# Altium schematic symbol library Electronic Devices_LIB.SchLib: 703 symbols (part 2 of 8)
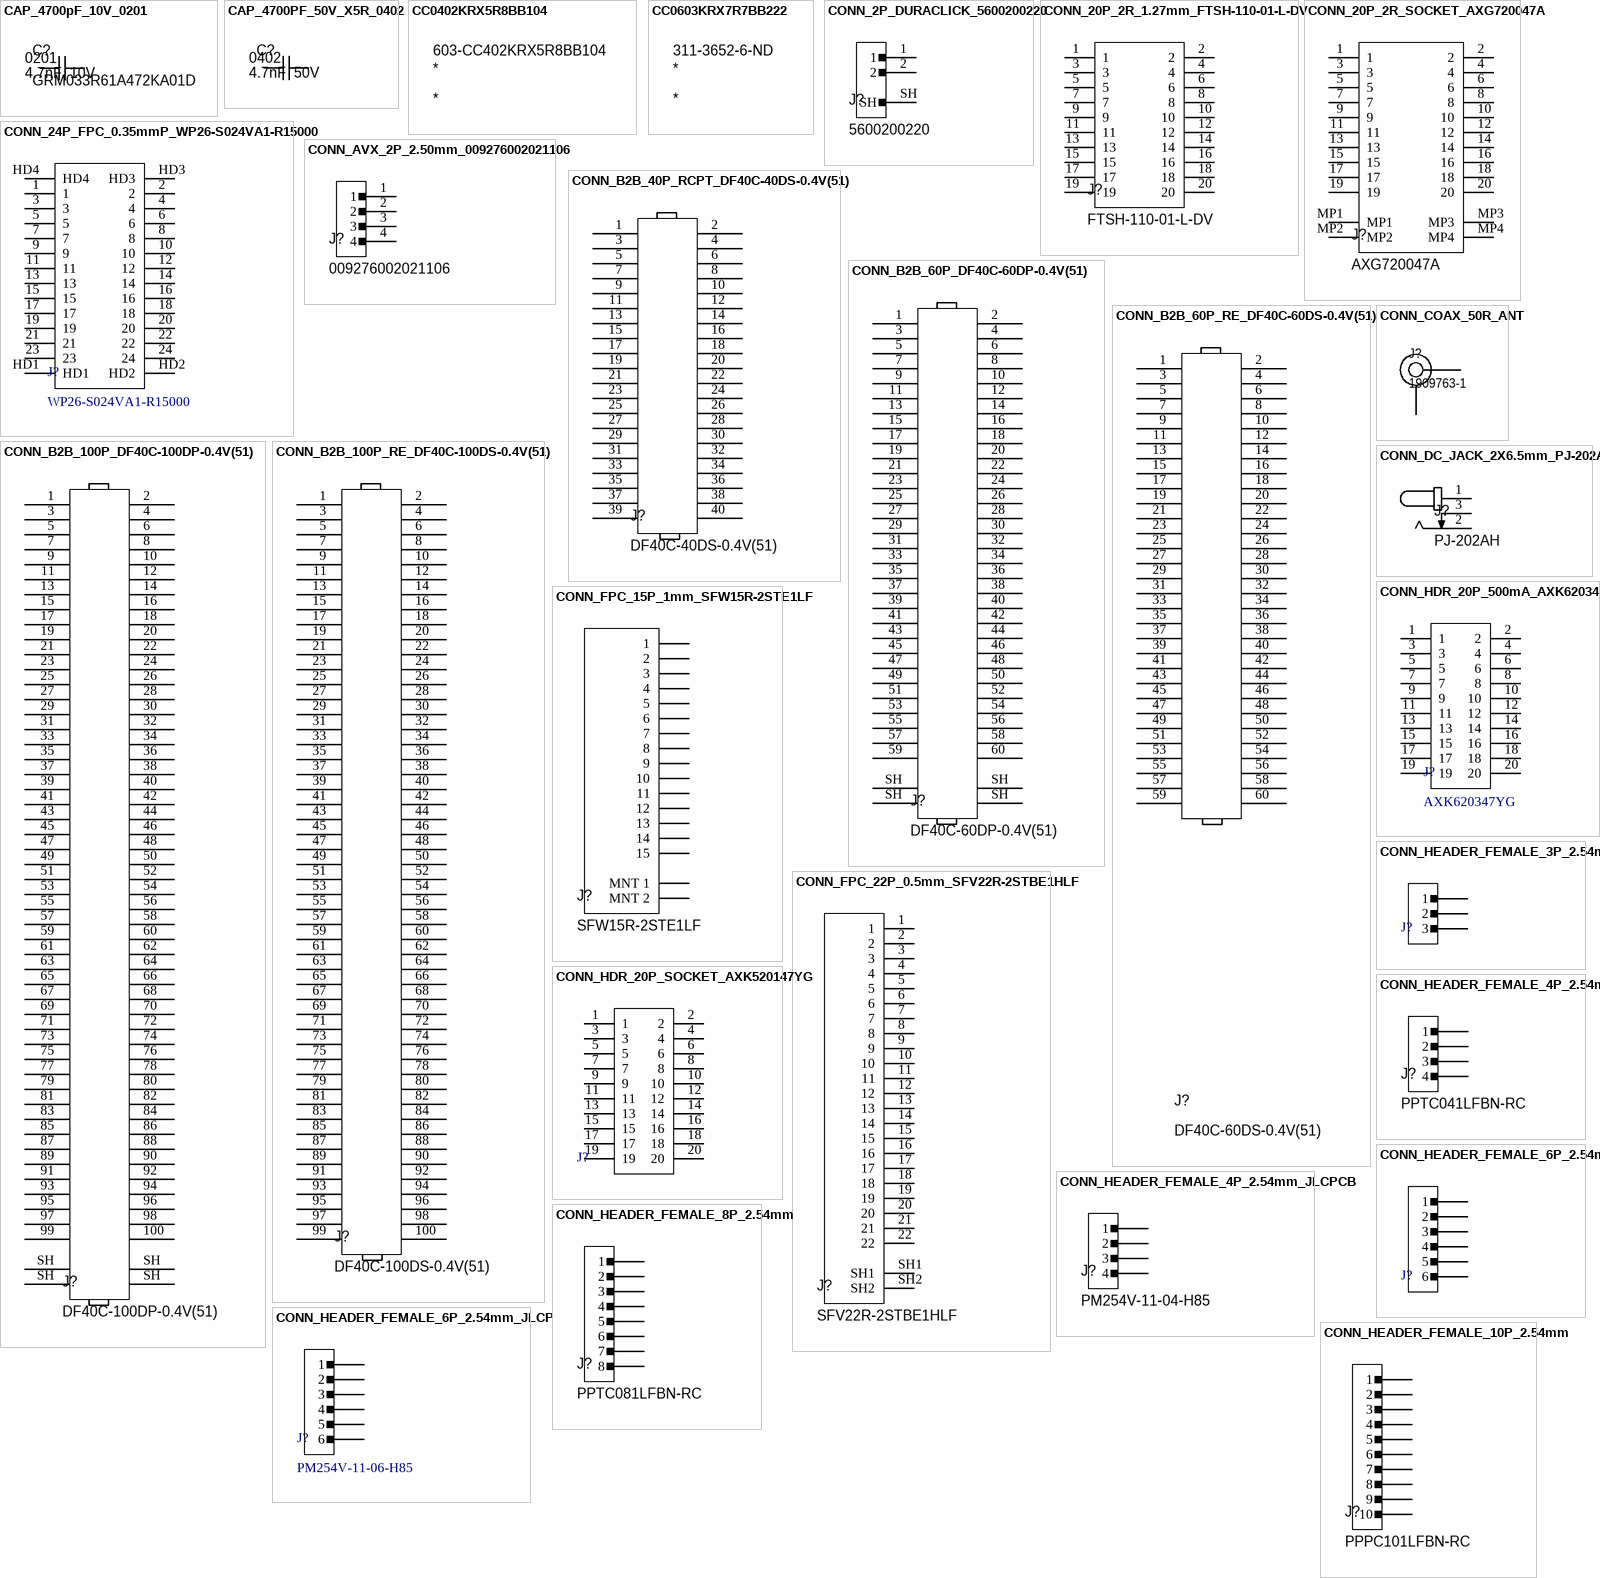
[diagram p37: symbols CAP_4700pF_10V_0201 to CONN_HEADER_FEMALE_10P_2.54mm]

## CONN_B2B_100P_RE_DF40C-100DS-0.4V(51)
designator J?, comment DF40C-100DS-0.4V(51)
Board-to-Board Connector with 0.4-mm Pitch, 1.5 - 4.0-mm Height - DF40 Series (HIROSE ELECTRIC); Voltage Rating: 30V; Current Rating: 300mA; Connector Type: Receptacle; Number of Positions: 100; Contact Resistance: 90mR; Pitch: 0.4mm; Mated Stacking Heights: 1.5mm; Contact Pitch: 400um; Supplier 1: Digikey; Manufacturer: Hirose; Manufacturer Part Number: DF40C-100DS-0.4V(51); RoHS: Yes; Category: Headers and Wire Housings; Stock 1: 4275; Pricing 1: 1=1.91, 10=1.661, 25=1.5908, 50=1.5554, 100=1.4847, 250=1.34328, 500=1.23724, 1000=1.0605, 2500=0.9898 (USD); Mount: Surface Mount; Contact Material: Bronze; Contact Plating: Gold; Housing Material: Polymer; Housing Color: Black; Min Operating Temperature: -35°C; Max Operating Temperature: 85°C; Number of Rows: 2; Packaging: Tape and Reel; Package Quantity: 1; Termination: SMD/SMT; Number of Contacts: 100; Orientation: Straight; Series: DF40; Max Current Rating: 300mA; Max Voltage Rating (AC): 30V; Gender: Receptacle; Contact Voltage Rating (AC): 30V; Contact Voltage Rating (DC): 30V; Length: 22.6mm; Depth: 3.38mm; Radiation Hardening: No; Reach SVHC Compliant: No; Lead Free: Lead Free; RoHS Compliant: Yes; ComponentLink1URL: https://datasheet.ciiva.com/26948/getdatasheetpartid-441624-26948933.pdf?src-supplier=Verical; ComponentLink1Description: https://datasheet.ciiva.com/26948/getdatasheetpartid-441624-26948933.pdf?src-supplier=Verical; ComponentLink2URL: https://datasheet.ciiva.com/46408/1824826-46408894.pdf?src-supplier=Element14; ComponentLink2Description: https://datasheet.ciiva.com/46408/1824826-46408894.pdf?src-supplier=Element14; Supplier Part Number 1: H11615CT-ND
footprint CONN_B2B_HIROSE_DF40C-100DS-0.4V(51) (0.016" (0.40mm))
pins: 1, 2, 3, 4, 5, 6, 7, 8, 9, 10, 11, 12, 13, 14, 15, 16, 17, 18, 19, 20, 21, 22, 23, 24, 25, 26, 27, 28, 29, 30, 31, 32, 33, 34, 35, 36, 37, 38, 39, 40, 41, 42, 43, 44, 45, 46, 47, 48, 49, 50, 51, 52, 53, 54, 55, 56, 57, 58, 59, 60, 61, 62, 63, 64, 65, 66, 67, 68, 69, 70, 71, 72, 73, 74, 75, 76, 77, 78, 79, 80, 81, 82, 83, 84, 85, 86, 87, 88, 89, 90, 91, 92, 93, 94, 95, 96, 97, 98, 99, 100

## CONN_COAX_50R_ANT
designator J?, comment 1909763-1
CONN UMCC JACK STR 50OHM SMD; Manufacturer: TE Connectivity AMP; Body Material: Polymer,Liquid Crystal Polymer; Body Plating: Gold; Dielectric Material: Polymer; Impedance: 50R; Max Frequency: 6GHz; Voltage Rating: 60V; Gender: Female; Connector System: Cable-to-Board; Number of Positions: 1; Sealable: No (Without); Mating Cycles: 30; Insertion Loss: 0.24dB; Supplier 1: Digi-Key; Manufacturer Part Number: 1909763-1; RoHS: Yes; Category: RF / Coaxial Connectors; Stock 1: 85127; Pricing 1: 1=0.6, 10=0.522, 25=0.4768, 50=0.4488, 100=0.43, 250=0.3926, 500=0.37392, 1000=0.30849, 2500=0.28044 (USD); Mount: Panel; Case/Package: SMD/SMT; Contact Material: Copper Alloy; Housing Color: Beige; Center Contact Plating: Gold; Contact Plating: Gold; Insulation Material: Thermoplastic; Min Operating Temperature: -40°C; Max Operating Temperature: 194°C; Packaging: Tape and Reel; Package Quantity: 1; Fastening Type: Pull,SNAP-ON; Termination: SMD/SMT; Connector Type: Jack; Series: -; Orientation: Straight; Frequency: 6GHz; Number of Ports: 1; Length: 3mm; Radiation Hardening: No; ELV: Compliant; Lead Free: Lead Free; RoHS Compliant: Yes; ComponentLink1URL: https://datasheet.ciiva.com/16312/eng-cd-1909763-b-16312469.pdf?src-supplier=Future+Electronics; ComponentLink1Description: https://datasheet.ciiva.com/16312/eng-cd-1909763-b-16312469.pdf?src-supplier=Future+Electronics; ComponentLink2URL: https://datasheet.ciiva.com/9423/eng-cd-1909763-b-9423785.pdf?src-supplier=Avnet; ComponentLink2Description: https://datasheet.ciiva.com/9423/eng-cd-1909763-b-9423785.pdf?src-supplier=Avnet; ComponentLink3URL: https://datasheet.ciiva.com/29191/eng-cd-1909763-b1-basefilename-29191146.pdf?src-supplier=Digi-Key; ComponentLink3Description: https://datasheet.ciiva.com/29191/eng-cd-1909763-b1-basefilename-29191146.pdf?src-supplier=Digi-Key; ComponentLink4URL: https://datasheet.ciiva.com/29191/eng-cd-1909763-b1-basefilename-29191148.pdf?src-supplier=Digi-Key; ComponentLink4Description: https://datasheet.ciiva.com/29191/eng-cd-1909763-b1-basefilename-29191148.pdf?src-supplier=Digi-Key; Supplier Part Number 1: A118077CT-ND
footprint CONN_COAX_3x3-L-25mil_RA_1909763-1 (1909763-1_TE_Coax_RightAngle_SMD_3x3mm_20mil Feed)
pins: 1 "Thermal Pad", 2 "Thermal Pad"

## CONN_DC_JACK_2X6.5mm_PJ-202AH
designator J?, comment PJ-202AH
2.0 x 6.5 mm, 5.0 A, Horizontal, Through Hole, Kinked Pins, Dc Power Jack Connector; Manufacturer: CUI Devices; Body Color: Black; Shielding: Unshielded; Gender: Male; Supplier 1: Digi-Key; Manufacturer Part Number: PJ-202AH; RoHS: Yes; Category: Power Connectors; Stock 1: 143167; Pricing 1: 1=0.78, 25=0.6528, 100=0.5988, 500=0.48902, 2500=0.40274, 10000=0.36162 (USD); Mount: Through Hole; Contact Plating: Silver; Contact Material: Brass; Housing Material: PBT; Min Operating Temperature: -25°C; Max Operating Temperature: 85°C; Connector Type: Jack; Termination: Kinked Pin; Series: -; Flammability Rating: UL94 V-0; ComponentLink1URL: https://datasheet.octopart.com/PJ-202AH-CUI-Devices-datasheet-137760703.pdf?src-supplier=Future+Electronics; ComponentLink1Description: https://datasheet.octopart.com/PJ-202AH-CUI-Devices-datasheet-137760703.pdf?src-supplier=Future+Electronics; ComponentLink2URL: https://datasheet.octopart.com/PJ-202AH-CUI-datasheet-54017.pdf?src-supplier=Digi-Key; ComponentLink2Description: https://datasheet.octopart.com/PJ-202AH-CUI-datasheet-54017.pdf?src-supplier=Digi-Key; ComponentLink3URL: https://datasheet.octopart.com/PJ-202AH-CUI-Devices-datasheet-141002001.pdf?src-supplier=Electro+Sonic; ComponentLink3Description: https://datasheet.octopart.com/PJ-202AH-CUI-Devices-datasheet-141002001.pdf?src-supplier=Electro+Sonic; Supplier Part Number 1: CP-202AH-ND
footprint CONN_CUI_PJ-202AH (Through Hole, Right Angle)
pins: 1, 2, 3

## CONN_FPC_15P_1mm_SFW15R-2STE1LF
designator J?, comment SFW15R-2STE1LF
Conn FFC/FPC Connector SKT 15 POS 1mm Solder RA SMD Embossed T/R; Manufacturer: Amphenol ICC / FCI; Actuator Material: Glass,Polyphenylene; Number of Contacts: 15; Current Rating: 1A; Voltage Rating: 100V; Contact Location: Top; Insulation Resistance: 500MR; Wire/Cable Type: Straight; Supplier 1: Mouser; Manufacturer Part Number: SFW15R-2STE1LF; RoHS: Yes; Category: FFC / FPC; Stock 1: 2000; Pricing 1: 1=0.64, 10=0.486, 50=0.486, 100=0.424, 500=0.404, 1000=0.333, 2000=0.308, 4000=0.284, 10000=0.265 (USD); Mount: Surface Mount; Contact Material: Bronze; Contact Plating: Tin; Housing Material: Polyphenylene; Min Operating Temperature: -55°C; Max Operating Temperature: 105°C; Number of Rows: 1; Termination: Solder; Orientation: Right Angle; Packaging: Tape and Reel; Voltage Rating (AC): 100V; Number of Positions: 15; Package Quantity: 2000; Series: SFW-R; Width: 5.5mm; Pitch: 1mm; Lead Free: Lead Free; Flammability Rating: UL94 V-0; RoHS Compliant: Yes; ComponentLink1URL: https://datasheet.ciiva.com/670/sfw12lf-670088.pdf?src-supplier=Digikey; ComponentLink1Description: https://datasheet.ciiva.com/670/sfw12lf-670088.pdf?src-supplier=Digikey; ComponentLink2URL: https://datasheet.ciiva.com/670/sfw12lf-670089.pdf?src-supplier=Digikey; ComponentLink2Description: https://datasheet.ciiva.com/670/sfw12lf-670089.pdf?src-supplier=Digikey; ComponentLink3URL: https://datasheet.ciiva.com/670/sfw12lf-670090.pdf?src-supplier=Digikey; ComponentLink3Description: https://datasheet.ciiva.com/670/sfw12lf-670090.pdf?src-supplier=Digikey; ComponentLink4URL: https://datasheet.ciiva.com/5138/sfw12lf-5138988.pdf?src-supplier=Mouser; ComponentLink4Description: https://datasheet.ciiva.com/5138/sfw12lf-5138988.pdf?src-supplier=Mouser; Supplier Part Number 1: 649-SFW15R-2STE1LF
footprint CONN_FPC_15P_1mm_Amphenol_0_0
pins: 1, 2, 3, 4, 5, 6, 7, 8, 9, 10, 11, 12, 13, 14, 15, 16 MNT 1, 17 MNT 2

## CONN_FPC_22P_0.5mm_SFV22R-2STBE1HLF
designator J?, comment SFV22R-2STBE1HLF
Conn FFC/FPC Connector SKT 22 POS 0.5mm Solder RA SMD Embossed T/R; Manufacturer: Amphenol ICC / FCI; Actuator Material: Glass,Polyphenylene; Voltage Rating: 50V; Current Rating: 500mA; Number of Positions: 22; Contact Location: Top; Insulation Resistance: 100MR; Wire/Cable Type: Straight; Supplier 1: Digikey; Manufacturer Part Number: SFV22R-2STBE1HLF; RoHS: Yes; Category: FFC / FPC; Stock 1: 4153; Pricing 1: 1=0.74, 10=0.627, 25=0.6016, 50=0.5888, 100=0.5633, 250=0.51208, 500=0.46086, 1000=0.40966 (USD); Mount: Surface Mount; Contact Material: Bronze; Contact Plating: Gold; Housing Material: Polymer; Min Operating Temperature: -55°C; Max Operating Temperature: 105°C; Termination: Solder; Number of Contacts: 22; Orientation: Right Angle; Packaging: Tape and Reel; Package Quantity: 3000; Series: SFV-R; Pitch: 0.5mm; Radiation Hardening: No; Flammability Rating: UL94 V-0; RoHS Compliant: Yes; ComponentLink1URL: https://datasheet.ciiva.com/18563/sfv12b-hlf-18563830.pdf?src-supplier=Digikey; ComponentLink1Description: https://datasheet.ciiva.com/18563/sfv12b-hlf-18563830.pdf?src-supplier=Digikey; Supplier Part Number 1: 609-SFV22R-2STBE1HLFCT-ND
footprint CONN_FPC_AMPHENOL_SFV22R-2STBE1HLF (Pitch 0.5mm)
pins: 1, 2, 3, 4, 5, 6, 7, 8, 9, 10, 11, 12, 13, 14, 15, 16, 17, 18, 19, 20, 21, 22, SH1, SH2

## CONN_HDR_20P_500mA_AXK620347YG
designator J?, comment AXK620347YG
AXK6(P5K) Header(0.5mm pitch, 20-pin, Ni-barrier) (RoHS conforming); Manufacturer: Panasonic; Max Voltage Rating (DC): 6.06kV; Max Current Rating: 10A; Contact Resistance: 60mR; Current Rating: 500mA; Voltage Rating: 60V; Number of Positions: 20; Mated Stacking Heights: 3mm; RoHS: Yes; Stock 1: 795; Pricing 1: 1=1,60000, 10=1,39500, 25=1,33560, 50=1,30600, 100=1,24660, 250=1,12784, 500=1,03880 (USD); Mount: Surface Mount; Contact Material: Copper Alloy; Contact Plating: Gold; Housing Material: Resin; Min Operating Temperature: -55°C; Max Operating Temperature: 85°C; Series: P5K; Package Quantity: 1; Packaging: Tape and Reel; Number of Rows: 2; Termination: SMD/SMT; Number of Contacts: 20; Orientation: Straight; Pitch: 0.5mm; RoHS Compliant: Yes; ComponentLink1URL: http://www.mouser.com/ds/2/315/AXK-1076013.pdf?src-supplier=Mouser; ComponentLink1Description: http://www.mouser.com/ds/2/315/AXK-1076013.pdf?src-supplier=Mouser; ComponentLink2URL: http://components.arrow.com/part/dataview/48803036S9793011N2972?src-supplier=Arrow+Electronics; ComponentLink2Description: http://components.arrow.com/part/dataview/48803036S9793011N2972?src-supplier=Arrow+Electronics; ComponentLink3URL: http://www3.panasonic.biz/ac/e_download/control/connector/base-base/catalog/con_eng_p5k.pdf?src-supplier=Digi-Key; ComponentLink3Description: http://www3.panasonic.biz/ac/e_download/control/connector/base-base/catalog/con_eng_p5k.pdf?src-supplier=Digi-Key; Supplier 1: Digi-Key; Supplier Part Number 1: 255-3241-1-ND; Supplier 2: Mouser; Supplier Part Number 2: 769-AXK620347YG; Supplier 3: Verical; Supplier Part Number 3: AXK620347YG; Manufacturer Part Number: AXK620347YG; Category: Headers and Wire Housings
footprint CONN_AXK620347YG (0.020" (0.50mm))
pins: 1, 2, 3, 4, 5, 6, 7, 8, 9, 10, 11, 12, 13, 14, 15, 16, 17, 18, 19, 20

## CONN_HDR_20P_SOCKET_AXK520147YG
designator J?, comment AXK520147YG  (value not drawn)
AXK5(P5K) Socket(0.5mm pitch, 20-pin, Ni-barrier) (RoHS conforming); Manufacturer: Panasonic; Max Voltage Rating (DC): 6.06kV; Max Current Rating: 10A; Contact Resistance: 60mR; Voltage Rating: 60V; Current Rating: 500mA; Number of Positions: 20; Mated Stacking Heights: 3.5mm; Supplier 1: Digi-Key; Supplier Part Number 1: 255-3218-1-ND; RoHS: Yes; Stock 1: 2733; Pricing 1: 1=1,60000, 10=1,39500, 25=1,33560, 50=1,30600, 100=1,24660, 250=1,12784, 500=1,03880 (USD); Mount: Surface Mount; Contact Plating: Gold; Contact Material: Copper Alloy; Housing Material: Resin; Min Operating Temperature: -55°C; Max Operating Temperature: 85°C; Series: P5K; Package Quantity: 1000; Number of Rows: 2; Packaging: Tape and Reel; Termination: Solder; Number of Contacts: 20; Max Voltage Rating (AC): 60V; Connector Type: Socket; Orientation: Straight; Length: 8.2mm; Pitch: 0.5mm; Depth: 5mm; RoHS Compliant: Yes; ComponentLink1URL: https://datasheet.ciiva.com/24372/5-eng-p5k-pdf-24372870.pdf?src-supplier=Onlinecomponents.com; ComponentLink1Description: https://datasheet.ciiva.com/24372/5-eng-p5k-pdf-24372870.pdf?src-supplier=Onlinecomponents.com; Manufacturer Part Number: AXK520147YG; Category: Connectors
footprint CONN_AXK520147YG (0.020" (0.50mm))
pins: 1, 2, 3, 4, 5, 6, 7, 8, 9, 10, 11, 12, 13, 14, 15, 16, 17, 18, 19, 20

## CONN_HEADER_FEMALE_3P_2.54mm
designator J?, comment SMC-1-03-1-GT  (value not drawn)
Machine Pin Socket 3P 1.00mm Pitch Plug; Manufacturer: Adam Equipment; Supplier 1: Digi-Key; Manufacturer Part Number: SMC-1-03-1-GT; RoHS: No; Category: Connectors; Stock 1: 5075; Pricing 1: 1=0.27000, 10=0.22500, 25=0.20000, 50=0.18660, 100=0.17330, 250=0.15332, 500=0.14666, 1000=0.11999, 2500=0.10999 (USD); ComponentLink1URL: http://www.adam-tech.com/downloader.php?p=SMC-1-XX-1-GT.pdf&src-supplier=Digi-Key; ComponentLink1Description: http://www.adam-tech.com/downloader.php?p=SMC-1-XX-1-GT.pdf&src-supplier=Digi-Key; Supplier Part Number 1: 2057-SMC-1-03-1-GT-ND
footprint CONN_HDR_FEMALE_3P (2.54mm Pitch,tht)
pins: 1, 2, 3

## CONN_HEADER_FEMALE_4P_2.54mm
designator J?, comment PPTC041LFBN-RC
CONN HEADER FEMALE 4POS .1 TIN; Manufacturer: Sullins; Number of Positions: 4; Voltage Rating: 250V; Pitch: 2.54mm; Supplier 1: Digikey; Manufacturer Part Number: PPTC041LFBN-RC; RoHS: Yes; Category: Connectors; Stock 1: 19863; Pricing 1: 1=0.46, 10=0.399, 100=0.3286, 500=0.28574, 1000=0.23574, 5000=0.20716, 10000=0.2041 (USD); Mount: Through Hole; Contact Material: Bronze; Housing Material: Plastic; Contact Finish - Mating: TIN; Insulation Color: Black; Insulation Material: Polyester; Contact Shape: Square; Min Operating Temperature: -40°C; Max Operating Temperature: 105°C; Number of Rows: 1; Packaging: Tray; Termination: Solder; Connector Type: Header; Contact Type: Female Socket; Fastening Type: Pull; Series: -; Length: 10.7mm; Width: 2.5mm; Height: 8.5mm; Lead Free: Lead Free; RoHS Compliant: Yes; Flammability Rating: UL94 V-0; ComponentLink1URL: https://media.digikey.com/pdf/Data%20Sheets/Sullins%20PDFs/Female_Headers.100_DS.pdf?src-supplier=Digikey; ComponentLink1Description: https://media.digikey.com/pdf/Data%20Sheets/Sullins%20PDFs/Female_Headers.100_DS.pdf?src-supplier=Digikey; ComponentLink2URL: http://www.sullinscorp.com/catalogs/78_Page80-81_HEADER_.100_2.54mm_FEMALE.pdf?src-supplier=Future+Electronics; ComponentLink2Description: http://www.sullinscorp.com/catalogs/78_Page80-81_HEADER_.100_2.54mm_FEMALE.pdf?src-supplier=Future+Electronics; ComponentLink3URL: https://datasheet.octopart.com/PPTC041LFBN-RC-Sullins-datasheet-41308905.pdf?src-supplier=Future+Electronics; ComponentLink3Description: https://datasheet.octopart.com/PPTC041LFBN-RC-Sullins-datasheet-41308905.pdf?src-supplier=Future+Electronics; Supplier Part Number 1: S7002-ND
pins: 1, 2, 3, 4

## CONN_HEADER_FEMALE_4P_2.54mm_JLCPCB
designator J?, comment PM254V-11-04-H85
2.54mm Plugin 4P Brass Straight 1x4P Plugin,P=2.54mm  Female Headers ROHS; Manufacturer: XFCN; Number of Positions: 4; Connector Type: Header; Voltage Rating: 250V; Supplier: Jlcpcb; Manufacturer Part Number: PM254V-11-04-H85; RoHS: Yes; Category: Connectors; Mount: Through Hole; Contact Material: Bronze; Housing Material: Plastic; Contact Finish - Mating: TIN; Insulation Color: Black; Insulation Material: Polyester; Contact Shape: Square; Min Operating Temperature: -40°C; Max Operating Temperature: 105°C; Number of Rows: 1; Packaging: Tray; Termination: Solder; Contact Type: Female Socket; Fastening Type: Pull; Series: -; Length: 10.7mm; Width: 2.5mm; Height: 8.5mm; Pitch: 2.54mm; Lead Free: Lead Free; RoHS Compliant: Yes; Flammability Rating: UL94 V-0; JLCPCB Part Number: C541851
footprint CONN_HEADER_FEM_4P (2.54mm)
pins: 1, 2, 3, 4

## CONN_HEADER_FEMALE_6P_2.54mm
designator J?, comment PPTC061LFBN-RC  (value not drawn)
Female, 6 C, Straight, .100"CC; 3.20mm Tail, No Mt. 100u" Tin; PBT, Phos Bronze, 105 C; Manufacturer: Sullins; Number of Positions: 6; Connector Type: Header; Pitch: 0.1inch; Manufacturer Part Number: PPTC061LFBN-RC; RoHS: Yes; Category: Connectors; Stock 1: 54862; Pricing 1: 1=0.52000, 10=0.44900, 80=0.37050, 440=0.32220, 1000=0.26582, 5000=0.23360, 10000=0.23270 (USD); Mount: Through Hole; Color: Black; Contact Plating: Tin; Contact Material: Bronze; Housing Material: Plastic; Package Quantity: 1000; Number of Rows: 1; Packaging: Bulk; Termination: Solder; Contact Type: Female Socket; Length: 15.7mm; Width: 2.5mm; Height: 8.5mm; Lead Free: Lead Free; RoHS Compliant: Yes; ComponentLink1URL: https://media.digikey.com/pdf/Data%20Sheets/Sullins%20PDFs/Female_Headers.100_DS.pdf?src-supplier=Digi-Key; ComponentLink1Description: https://media.digikey.com/pdf/Data%20Sheets/Sullins%20PDFs/Female_Headers.100_DS.pdf?src-supplier=Digi-Key; ComponentLink2URL: http://www.sullinscorp.com/catalogs/78_Page80-81_HEADER_.100_2.54mm_FEMALE.pdf?src-supplier=Future+Electronics; ComponentLink2Description: http://www.sullinscorp.com/catalogs/78_Page80-81_HEADER_.100_2.54mm_FEMALE.pdf?src-supplier=Future+Electronics; Supplier 1: Digi-Key; Supplier 2: Future Electronics; Supplier 3: Verical; Supplier Part Number 1: S7004-ND; Supplier Part Number 2: 5286703; Supplier Part Number 3: PPTC061LFBN-RC
footprint CONN_HDR_FEMALE_6P (2.54mm Pitch,tht)
pins: 1, 2, 3, 4, 5, 6

## CONN_HEADER_FEMALE_6P_2.54mm_JLCPCB
designator J?, comment PM254V-11-06-H85
2.54mm Plugin 3A 6P -40℃~+105℃ 250V Straight 1x6P Top Square Holes Plugin,P=2.54mm  Female Headers ROHS; Manufacturer: XFCN; Number of Positions: 6; Connector Type: Header; Pitch: 0.1inch; Manufacturer Part Number: PM254V-11-06-H85; RoHS: Yes; Category: Connectors; Mount: Through Hole; Color: Black; Contact Plating: Tin; Contact Material: Bronze; Housing Material: Plastic; Package Quantity: 1000; Number of Rows: 1; Termination: Solder; Contact Type: Female Socket; Length: 15.7mm; Width: 2.5mm; Height: 8.5mm; Lead Free: Lead Free; RoHS Compliant: Yes; Supplier: Jlcpcb; JLCPCB Part Number: C2832269
footprint CONN_HDR_FEMALE_6P (2.54mm Pitch,tht)
pins: 1, 2, 3, 4, 5, 6

## CONN_HEADER_FEMALE_8P_2.54mm
designator J?, comment PPTC081LFBN-RC
Female, 8C, Straight, .100"CC; 3.20mm Tail, No Mt. 100u" Tin; PBT, Phos Bronze, 105 C; Manufacturer: Sullins; Number of Positions: 8; Connector Type: Header; Voltage Rating: 250V; Pitch: 2.54mm; Supplier 1: Digi-Key; Manufacturer Part Number: PPTC081LFBN-RC; RoHS: Yes; Category: Connectors; Stock 1: 43354; Pricing 1: 1=0.66, 10=0.571, 400=0.42998, 800=0.36855, 1200=0.33783, 5200=0.29689, 10000=0.2925 (USD); Mount: Through Hole; Contact Material: Bronze; Housing Material: Plastic; Contact Finish - Mating: TIN; Insulation Color: Black; Insulation Material: Polyester; Contact Shape: Square; Min Operating Temperature: -40°C; Max Operating Temperature: 105°C; Number of Rows: 1; Packaging: Tray; Termination: Solder; Contact Type: Female Socket; Fastening Type: Pull; Series: -; Length: 20.8mm; Width: 2.5mm; Height: 8.5mm; Lead Free: Lead Free; RoHS Compliant: Yes; Flammability Rating: UL94 V-0; ComponentLink1URL: https://media.digikey.com/pdf/Data%20Sheets/Sullins%20PDFs/Female_Headers.100_DS.pdf?src-supplier=Digi-Key; ComponentLink1Description: https://media.digikey.com/pdf/Data%20Sheets/Sullins%20PDFs/Female_Headers.100_DS.pdf?src-supplier=Digi-Key; ComponentLink2URL: http://www.sullinscorp.com/catalogs/78_Page80-81_HEADER_.100_2.54mm_FEMALE.pdf?src-supplier=Future+Electronics; ComponentLink2Description: http://www.sullinscorp.com/catalogs/78_Page80-81_HEADER_.100_2.54mm_FEMALE.pdf?src-supplier=Future+Electronics; ComponentLink3URL: https://datasheet.octopart.com/PPTC081LFBN-RC-Sullins-datasheet-41308905.pdf?src-supplier=Future+Electronics; ComponentLink3Description: https://datasheet.octopart.com/PPTC081LFBN-RC-Sullins-datasheet-41308905.pdf?src-supplier=Future+Electronics; Supplier Part Number 1: S7006-ND
footprint CONN_HEADER_FEM_8P (0.100" (2.54mm))
pins: 1, 2, 3, 4, 5, 6, 7, 8

## CONN_HEADER_FEMALE_10P_2.54mm
designator J?, comment PPPC101LFBN-RC
10 Position Total Single Row 2.54 mm Pitch Straight Female Header; Manufacturer: Sullins; Number of Positions: 10; Pitch: 0.1inch; Supplier 1: Digi-Key; Manufacturer Part Number: PPPC101LFBN-RC; RoHS: Yes; Category: Headers and Wire Housings; Stock 1: 71922; Pricing 1: 1=0.68, 10=0.571, 80=0.51288, 440=0.41959, 1000=0.37296, 5000=0.3367 (USD); Mount: Through Hole; Contact Material: Bronze; Housing Material: Plastic; Color: Black; Contact Plating: Gold; Number of Rows: 1; Packaging: Bulk; Termination: Solder; Connector Type: Header; Contact Type: Female Socket; Package Quantity: 1000; Length: 25.9mm; Width: 2.5mm; Height: 8.5mm; Lead Free: Lead Free; RoHS Compliant: Yes; ComponentLink1URL: https://media.digikey.com/pdf/Data%20Sheets/Sullins%20PDFs/Female_Headers.100_DS.pdf?src-supplier=Digi-Key; ComponentLink1Description: https://media.digikey.com/pdf/Data%20Sheets/Sullins%20PDFs/Female_Headers.100_DS.pdf?src-supplier=Digi-Key; ComponentLink2URL: http://www.sullinscorp.com/catalogs/78_Page80-81_HEADER_.100_2.54mm_FEMALE.pdf?src-supplier=Future+Electronics; ComponentLink2Description: http://www.sullinscorp.com/catalogs/78_Page80-81_HEADER_.100_2.54mm_FEMALE.pdf?src-supplier=Future+Electronics; ComponentLink3URL: https://datasheet.octopart.com/PPPC101LFBN-RC-Sullins-datasheet-41308905.pdf?src-supplier=Future+Electronics; ComponentLink3Description: https://datasheet.octopart.com/PPPC101LFBN-RC-Sullins-datasheet-41308905.pdf?src-supplier=Future+Electronics; Supplier Part Number 1: S7043-ND
footprint CONN_HEADER_FEM_10P (0.100" (2.54mm))
pins: 1, 2, 3, 4, 5, 6, 7, 8, 9, 10

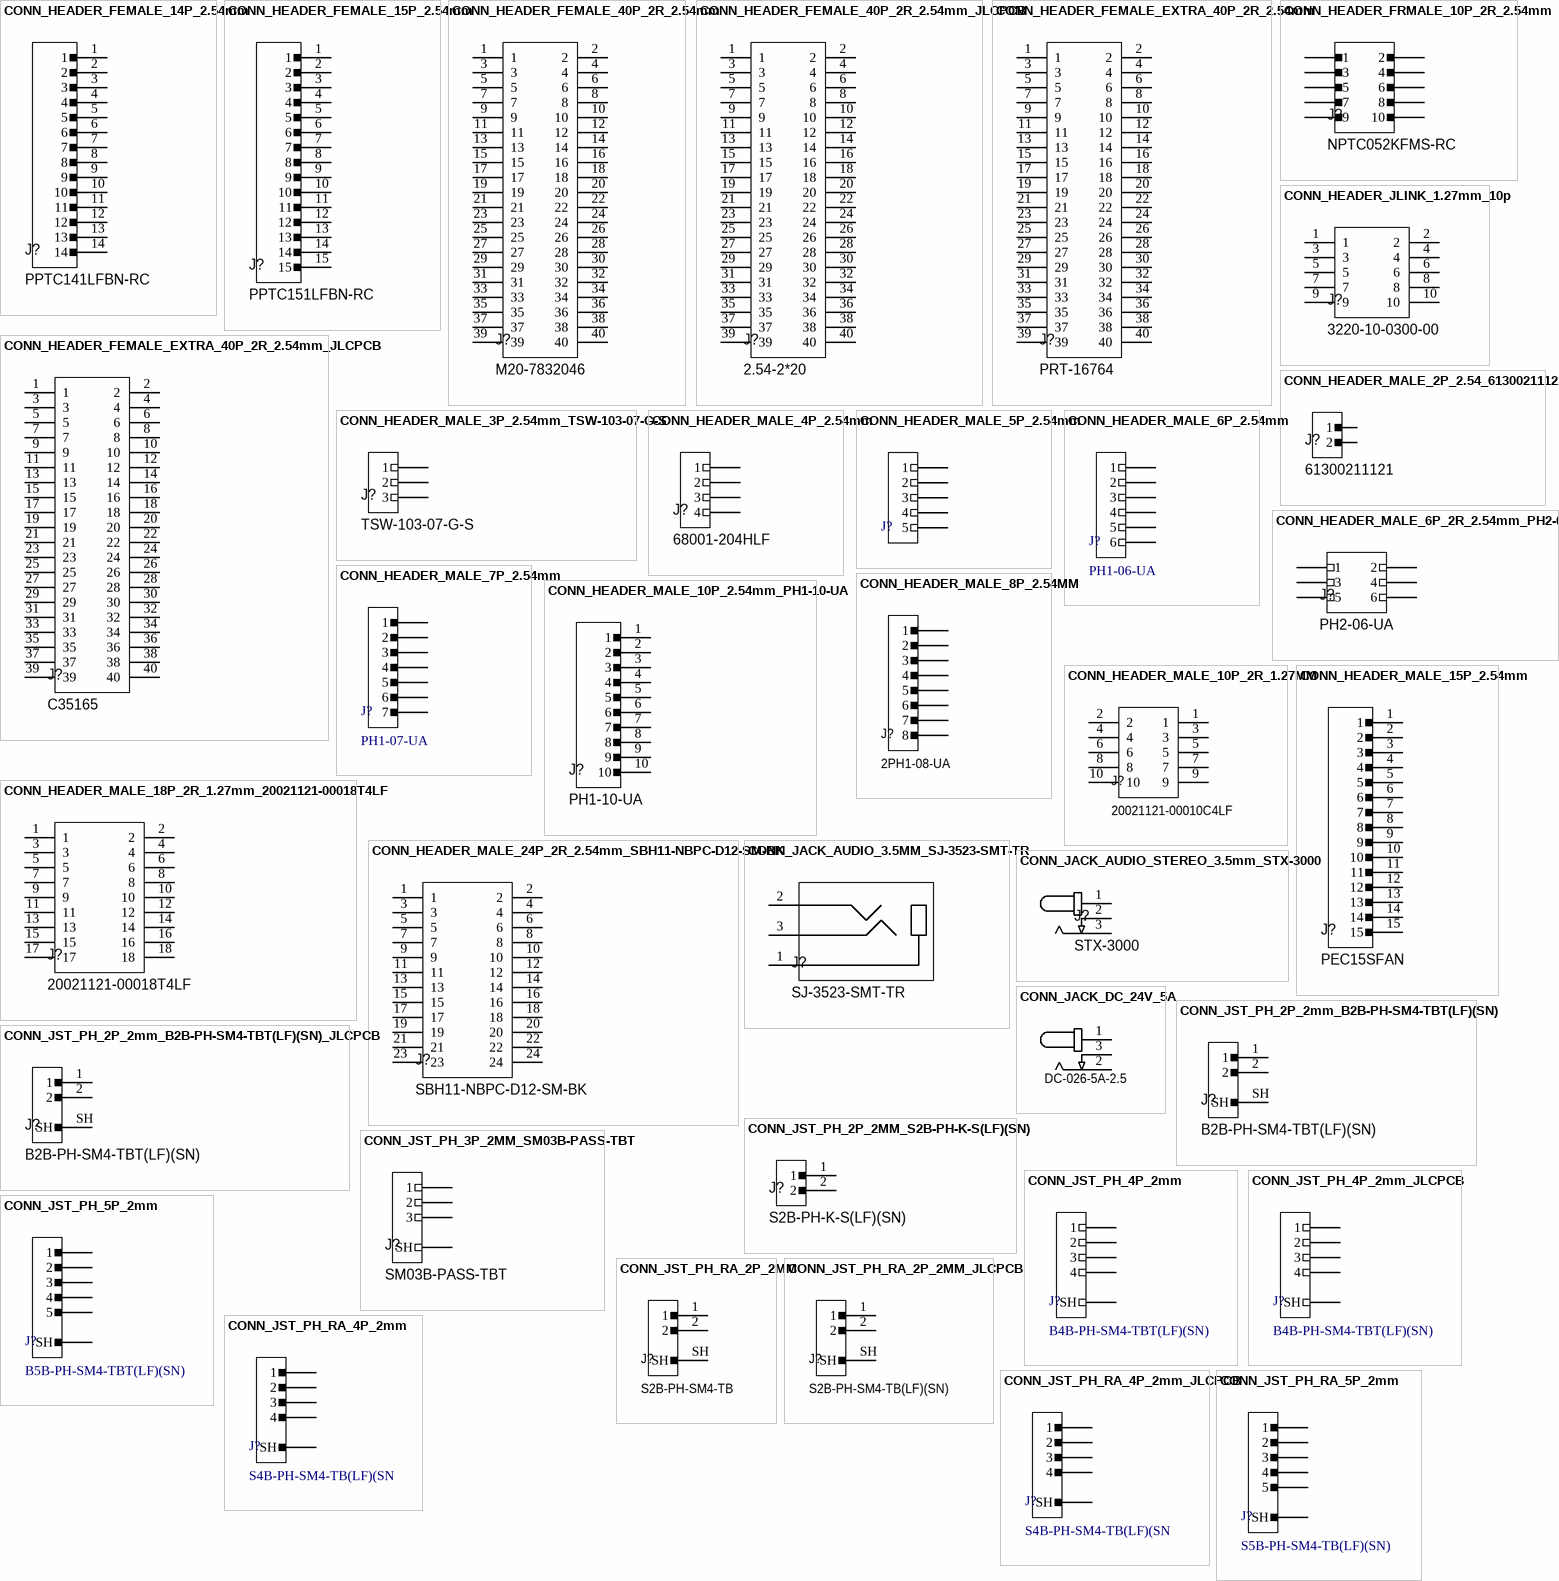
[diagram p4: symbols CONN_HEADER_FEMALE_14P_2.54mm to CONN_JST_PH_RA_5P_2mm]

## CONN_HEADER_FEMALE_14P_2.54mm
designator J?, comment PPTC141LFBN-RC
PPTC Series 14 Position 2.54 mm Single Row Through Hole Pin Header; Manufacturer: Sullins; Number of Positions: 14; Voltage Rating: 250V; Supplier 1: Digikey; Manufacturer Part Number: PPTC141LFBN-RC; RoHS: Yes; Category: Connectors; Stock 1: 3902; Pricing 1: 1=0.92, 10=0.78, 80=0.70075, 440=0.5733, 1000=0.5096, 5000=0.455 (USD); Mount: Through Hole; Contact Material: Bronze; Housing Material: Plastic; Contact Finish - Mating: TIN; Insulation Color: Black; Insulation Material: Polyester; Contact Shape: Square; Min Operating Temperature: -40°C; Max Operating Temperature: 105°C; Number of Rows: 1; Packaging: Tray; Termination: Solder; Connector Type: Header; Contact Type: Female Socket; Fastening Type: Pull; Series: -; Length: 36.1mm; Width: 2.5mm; Height: 8.5mm; Lead Free: Lead Free; RoHS Compliant: Yes; Flammability Rating: UL94 V-0; ComponentLink1URL: https://media.digikey.com/pdf/Data%20Sheets/Sullins%20PDFs/Female_Headers.100_DS.pdf?src-supplier=Digikey; ComponentLink1Description: https://media.digikey.com/pdf/Data%20Sheets/Sullins%20PDFs/Female_Headers.100_DS.pdf?src-supplier=Digikey; Supplier Part Number 1: S7012-ND
footprint CONN_HEADER_RHDR14W80P0X254_1X14_3606X254X850P
pins: 1, 2, 3, 4, 5, 6, 7, 8, 9, 10, 11, 12, 13, 14

## CONN_HEADER_FEMALE_15P_2.54mm
designator J?, comment PPTC151LFBN-RC
CONN HEADER FEMALE 15POS.1 TIN; Manufacturer: Sullins; Number of Positions: 15; Voltage Rating: 250V; Supplier 1: Digikey; Manufacturer Part Number: PPTC151LFBN-RC; RoHS: Yes; Category: Headers and Wire Housings; Stock 1: 11141; Pricing 1: 1=0.99, 10=0.836, 80=0.75075, 440=0.61425, 1000=0.546, 5000=0.4875 (USD); Mount: Through Hole; Contact Material: Bronze; Housing Material: Plastic; Contact Finish - Mating: TIN; Insulation Color: Black; Insulation Material: Polyester; Contact Shape: Square; Min Operating Temperature: -40°C; Max Operating Temperature: 105°C; Number of Rows: 1; Termination: Solder; Connector Type: Header; Contact Type: Female Socket; Fastening Type: Pull; Series: -; Length: 38.6mm; Width: 2.5mm; Height: 8.5mm; Lead Free: Lead Free; RoHS Compliant: Yes; Flammability Rating: UL94 V-0; ComponentLink1URL: https://media.digikey.com/pdf/Data%20Sheets/Sullins%20PDFs/Female_Headers.100_DS.pdf?src-supplier=Digikey; ComponentLink1Description: https://media.digikey.com/pdf/Data%20Sheets/Sullins%20PDFs/Female_Headers.100_DS.pdf?src-supplier=Digikey; Supplier Part Number 1: S7013-ND
footprint HEADER_MALE_15P
pins: 1, 2, 3, 4, 5, 6, 7, 8, 9, 10, 11, 12, 13, 14, 15

## CONN_HEADER_FEMALE_40P_2R_2.54mm
designator J?, comment M20-7832046
2.54mm (0.1") Pitch DIL Vertical PC Tail Socket Assembly, tin, 20+20 contacts; Manufacturer: Harwin; Number of Contacts: 40; Current Rating: 3A; Contact Resistance: 20mR; Mating Cycles: 50; Gender: Receptacle; Insulation Resistance: 1MR; Voltage Rating: 1kV; Hole Diameter: 0.8mm; Mated Stacking Heights: 12.63mm; Supplier 1: Digikey; Manufacturer Part Number: M20-7832046; RoHS: Yes; Category: Headers and Wire Housings; Stock 1: 3379; Pricing 1: 1=3.96, 11=3.59909, 110=3.17136, 506=2.69569, 1001=2.29926 (USD); Mount: Through Hole; Contact Plating: Tin; Contact Material: Bronze; Color: Black; Material: Glass,Polyester; Housing Color: Black; Housing Material: Nylon; Contact Finish - Mating: TIN; Insulation Color: Black; Insulation Material: Nylon; Contact Shape: Square; Min Operating Temperature: -40°C; Max Operating Temperature: 105°C; Number of Rows: 2; Termination: Solder; Packaging: Rail/Tube; Max Current Rating: 3A; Contact Gender: Female; Package Quantity: 11; Number of Positions: 40; Connector Type: Receptacle; Orientation: Straight; Series: M20; Contact Type: Female Socket; Fastening Type: Pull; Length: 51.2mm; Pitch: 2.54mm; Lead Pitch: 2.54mm; Depth: 5mm; Radiation Hardening: No; Reach SVHC Compliant: No; RoHS Compliant: Yes; Flammability Rating: UL94 V-0; ComponentLink1URL: https://datasheet.ciiva.com/11748/0900766b80dc1d2a-11748805.pdf?src-supplier=Rs; ComponentLink1Description: https://datasheet.ciiva.com/11748/0900766b80dc1d2a-11748805.pdf?src-supplier=Rs; ComponentLink2URL: https://datasheet.ciiva.com/26852/getdatasheetpartid-499542-26852174.pdf?src-supplier=Verical; ComponentLink2Description: https://datasheet.ciiva.com/26852/getdatasheetpartid-499542-26852174.pdf?src-supplier=Verical; ComponentLink3URL: https://datasheet.ciiva.com/9479/m20-783-9479864.pdf?src-supplier=Avnet; ComponentLink3Description: https://datasheet.ciiva.com/9479/m20-783-9479864.pdf?src-supplier=Avnet; ComponentLink4URL: https://datasheet.ciiva.com/6795/m20-783-6795342.pdf?src-supplier=Digikey; ComponentLink4Description: https://datasheet.ciiva.com/6795/m20-783-6795342.pdf?src-supplier=Digikey; ComponentLink5URL: https://datasheet.ciiva.com/7639/1836950-7639737.pdf?src-supplier=Element14; ComponentLink5Description: https://datasheet.ciiva.com/7639/1836950-7639737.pdf?src-supplier=Element14; Supplier Part Number 1: 952-2150-ND
footprint CONN_HEADER_FEM_RHDR40W65P254_2X20_5120X504X850P (2.54mm)
pins: 1, 2, 3, 4, 5, 6, 7, 8, 9, 10, 11, 12, 13, 14, 15, 16, 17, 18, 19, 20, 21, 22, 23, 24, 25, 26, 27, 28, 29, 30, 31, 32, 33, 34, 35, 36, 37, 38, 39, 40

## CONN_HEADER_FEMALE_40P_2R_2.54mm_JLCPCB
designator J?, comment 2.54-2*20
2.54mm 2.54mm 双排 2.5A 40P -40℃~+105℃ Straight 2x20P 8.5mm Top Square Holes Plugin,P=2.54mm  Female Headers ROHS; Manufacturer: ZHOURI; Number of Contacts: 40; Current Rating: 3A; Contact Resistance: 20mR; Mating Cycles: 50; Gender: Receptacle; Insulation Resistance: 1MR; Voltage Rating: 1kV; Hole Diameter: 0.8mm; Mated Stacking Heights: 12.63mm; Manufacturer Part Number: 2.54-2*20; RoHS: Yes; Category: Headers and Wire Housings; Mount: Through Hole; Contact Plating: Tin; Contact Material: Bronze; Color: Black; Material: Glass,Polyester; Housing Color: Black; Housing Material: Nylon; Contact Finish - Mating: TIN; Insulation Color: Black; Insulation Material: Nylon; Contact Shape: Square; Min Operating Temperature: -40°C; Max Operating Temperature: 105°C; Number of Rows: 2; Termination: Solder; Packaging: Rail/Tube; Max Current Rating: 3A; Contact Gender: Female; Package Quantity: 11; Number of Positions: 40; Connector Type: Receptacle; Orientation: Straight; Series: M20; Contact Type: Female Socket; Fastening Type: Pull; Length: 51.2mm; Pitch: 2.54mm; Lead Pitch: 2.54mm; Depth: 5mm; Radiation Hardening: No; Reach SVHC Compliant: No; RoHS Compliant: Yes; Flammability Rating: UL94 V-0; Supplier Part Number 1: 952-2150-ND; Supplier 1: Jlcpcb; JLCPCB Part Number: C2977589
footprint CONN_HEADER_FEM_RHDR40W65P254_2X20_5120X504X850P (2.54mm)
pins: 1, 2, 3, 4, 5, 6, 7, 8, 9, 10, 11, 12, 13, 14, 15, 16, 17, 18, 19, 20, 21, 22, 23, 24, 25, 26, 27, 28, 29, 30, 31, 32, 33, 34, 35, 36, 37, 38, 39, 40

## CONN_HEADER_FEMALE_EXTRA_40P_2R_2.54mm
designator J?, comment PRT-16764
Headers & Wire Housings Extended GPIO Female Header - 2x20 Pin (13.5mm/9.80mm); Manufacturer: SparkFun; Number of Positions: 40; Supplier 1: Mouser; Manufacturer Part Number: PRT-16764; RoHS: No; Category: Connectors; Stock 1: 1389; Pricing 1: 1=1.94, 10=1.94, 50=1.94, 100=1.94, 1000=1.94, 10000=1.94 (USD); Mount: Through Hole; Contact Material: Brass; Contact Finish - Mating: GOLD; Insulation Color: Black; Insulation Material: Nylon; Contact Shape: Square; Min Operating Temperature: -40°C; Max Operating Temperature: 105°C; Fastening Type: Pull; Series: -; Contact Type: Forked; Termination: Solder; Number of Rows: 2; Flammability Rating: UL94 V-0; ComponentLink1URL: https://cdn.sparkfun.com/assets/0/8/d/b/2/DS-16764-2_X_20_Pin_Extended_GPIO_Header_-_Female_-_13.5mm_9.80mm.pdf?src-supplier=Digikey; ComponentLink1Description: https://cdn.sparkfun.com/assets/0/8/d/b/2/DS-16764-2_X_20_Pin_Extended_GPIO_Header_-_Female_-_13.5mm_9.80mm.pdf?src-supplier=Digikey; Supplier Part Number 1: 474-PRT-16764
footprint CONN_HEADER_FEM_EXTRA_RHDR40W64P254_2X20_5130X500X1375P
pins: 1, 2, 3, 4, 5, 6, 7, 8, 9, 10, 11, 12, 13, 14, 15, 16, 17, 18, 19, 20, 21, 22, 23, 24, 25, 26, 27, 28, 29, 30, 31, 32, 33, 34, 35, 36, 37, 38, 39, 40

## CONN_HEADER_FEMALE_EXTRA_40P_2R_2.54mm_JLCPCB
designator J?, comment C35165
2.54mm 2.54mm 双排 40P Brass Straight 2x20P Plugin,P=2.54mm  Female Headers ROHS; Manufacturer: BOOMELE(Boom Precision Elec); Number of Positions: 40; Supplier 1: Jlcpcb; Manufacturer Part Number: C35165; RoHS: No; Category: Connectors; Stock 1: 1389; Pricing 1: 1=1.94, 10=1.94, 50=1.94, 100=1.94, 1000=1.94, 10000=1.94 (USD); Mount: Through Hole; Contact Material: Brass; Contact Finish - Mating: GOLD; Insulation Color: Black; Insulation Material: Nylon; Contact Shape: Square; Min Operating Temperature: -40°C; Max Operating Temperature: 105°C; Fastening Type: Pull; Series: -; Contact Type: Forked; Termination: Solder; Number of Rows: 2; ComponentLink1URL: https://cdn.sparkfun.com/assets/0/8/d/b/2/DS-16764-2_X_20_Pin_Extended_GPIO_Header_-_Female_-_13.5mm_9.80mm.pdf?src-supplier=Digikey; ComponentLink1Description: https://cdn.sparkfun.com/assets/0/8/d/b/2/DS-16764-2_X_20_Pin_Extended_GPIO_Header_-_Female_-_13.5mm_9.80mm.pdf?src-supplier=Digikey; JLCPCB Part Number: C35165
footprint CONN_HEADER_FEM_EXTRA_RHDR40W64P254_2X20_5130X500X1375P
pins: 1, 2, 3, 4, 5, 6, 7, 8, 9, 10, 11, 12, 13, 14, 15, 16, 17, 18, 19, 20, 21, 22, 23, 24, 25, 26, 27, 28, 29, 30, 31, 32, 33, 34, 35, 36, 37, 38, 39, 40

## CONN_HEADER_FRMALE_10P_2R_2.54mm
designator J?, comment NPTC052KFMS-RC
10 Position 2 Row 2.54 mm Pitch Female Socket Connector; Manufacturer: Sullins; Number of Positions: 10; Connector Type: Header; Voltage Rating: 250V; Supplier 1: Digi-Key; Manufacturer Part Number: NPTC052KFMS-RC; RoHS: Yes; Category: Connectors; Stock 1: 11141; Pricing 1: 1=1.29, 10=1.123, 100=1.0033, 500=0.83606, 1000=0.71662, 5000=0.6825 (USD); Mount: Surface Mount; Contact Material: Bronze; Housing Color: Black; Housing Material: Nylon; Contact Finish - Mating: TIN; Insulation Color: Black; Insulation Material: Nylon; Contact Shape: Square; Min Operating Temperature: -40°C; Max Operating Temperature: 125°C; Number of Rows: 2; Packaging: Rail/Tube; Termination: Solder; Contact Type: Female Socket; Fastening Type: Pull; Series: -; Length: 13.2mm; Width: 5mm; Height: 7.1mm; Lead Free: Lead Free; RoHS Compliant: Yes; Flammability Rating: UL94 V-0; ComponentLink1URL: https://datasheet.ciiva.com/745/npxcxx2kfmx-rc10488-d-745402.pdf?src-supplier=Digi-Key; ComponentLink1Description: https://datasheet.ciiva.com/745/npxcxx2kfmx-rc10488-d-745402.pdf?src-supplier=Digi-Key; Supplier Part Number 1: S5675-ND
footprint CONN_HEADER_FEM_61031021821 (0.100" (2.54mm))
pins: 1, 2, 3, 4, 5, 6, 7, 8, 9, 10
